# Altium integrated library ADLib_GoodToUse.IntLib: 276 symbols (part 1 of 2)
Pins are listed as number, name and electrical type; pins without a type are passive.

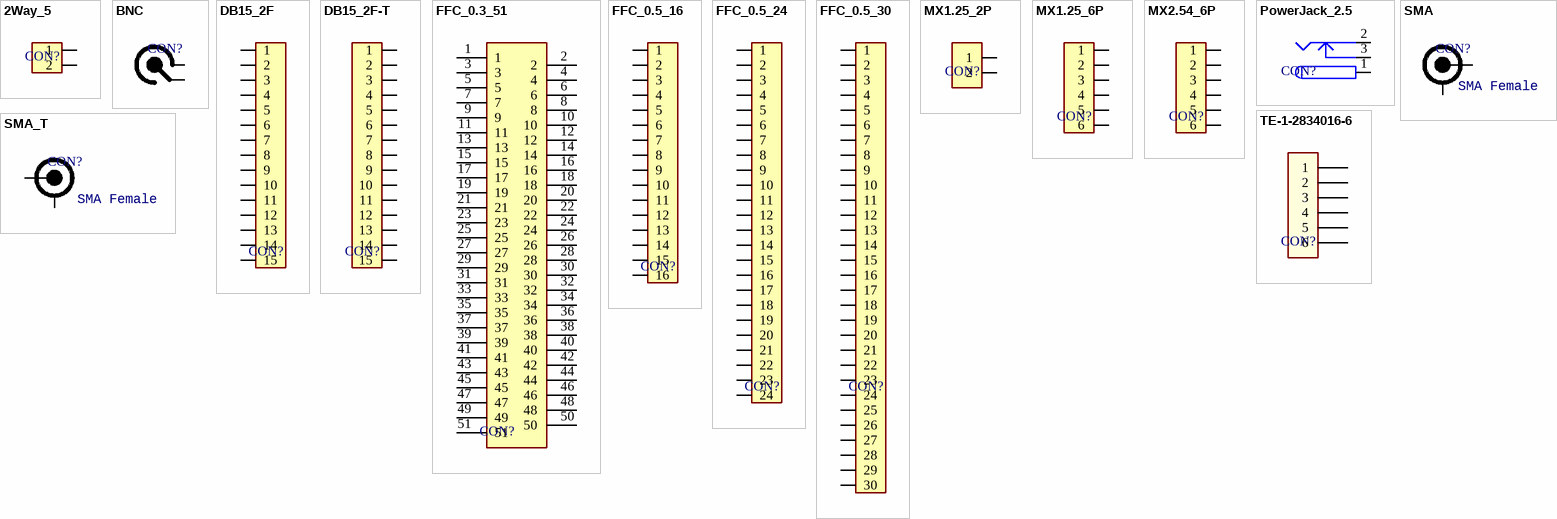
[diagram p0: symbols 2Way_5 to TE-1-2834016-6]

## 2Way_5
designator CON?  (value not drawn)
DB
footprint 2Way_5
pins: 1, 2

## BNC
designator CON?  (value not drawn)
footprint BNC_4P
pins: 1, 2

## DB15_2F
designator CON?  (value not drawn)
DB
footprint DB15_2F
pins: 1, 2, 3, 4, 5, 6, 7, 8, 9, 10, 11, 12, 13, 14, 15

## DB15_2F-T
designator CON?  (value not drawn)
DB
footprint DB15_2F
pins: 1, 2, 3, 4, 5, 6, 7, 8, 9, 10, 11, 12, 13, 14, 15

## FFC_0.3_51
designator CON?  (value not drawn)
FFC
footprint FFC_0.3_51
pins: 1, 2, 3, 4, 5, 6, 7, 8, 9, 10, 11, 12, 13, 14, 15, 16, 17, 18, 19, 20, 21, 22, 23, 24, 25, 26, 27, 28, 29, 30, 31, 32, 33, 34, 35, 36, 37, 38, 39, 40, 41, 42, 43, 44, 45, 46, 47, 48, 49, 50, 51

## FFC_0.5_16
designator CON?  (value not drawn)
FFC
footprint FFC_0.5_16
pins: 1, 2, 3, 4, 5, 6, 7, 8, 9, 10, 11, 12, 13, 14, 15, 16

## FFC_0.5_24
designator CON?  (value not drawn)
FFC
footprint FFC_0.5_24 (Connector; FH12 Series; 24 Position; 0.5mm Spaced Bottom Contact)
pins: 1, 2, 3, 4, 5, 6, 7, 8, 9, 10, 11, 12, 13, 14, 15, 16, 17, 18, 19, 20, 21, 22, 23, 24

## FFC_0.5_30
designator CON?  (value not drawn)
FFC
footprint FFC_0.5_30
pins: 1, 2, 3, 4, 5, 6, 7, 8, 9, 10, 11, 12, 13, 14, 15, 16, 17, 18, 19, 20, 21, 22, 23, 24, 25, 26, 27, 28, 29, 30

## MX1.25_2P
designator CON?  (value not drawn)
MX
footprint MX1.25_S90_2P
pins: 1, 2

## MX1.25_6P
designator CON?  (value not drawn)
MX
footprint MX1.25_S90_6P
footprint MX1.25s_S90_6P
pins: 0, 1, 2, 3, 4, 5, 6

## MX2.54_6P
designator CON?  (value not drawn)
MX
footprint MX2.54_S90_6P
pins: 1, 2, 3, 4, 5, 6

## PowerJack_2.5
designator CON?  (value not drawn)
DC Power Jack
footprint KLD_0202
pins: 1 (power), 2 (power), 3 (power)

## SMA
designator CON?  type: SMA Female  (hidden comment: SMA)
footprint SMA_KE_90
pins: 1, 2

## SMA_T
designator CON?  type: SMA Female  (hidden comment: SMA_T)
SMA
footprint SMA_KE_90
pins: 1, 2

## TE-1-2834016-6
designator CON?  (value not drawn)
MX; MFR: TE; Package: DIP; PartNumber: TE-1-2834016-6
footprint TE-1-2834016-6
pins: 1, 2, 3, 4, 5, 6


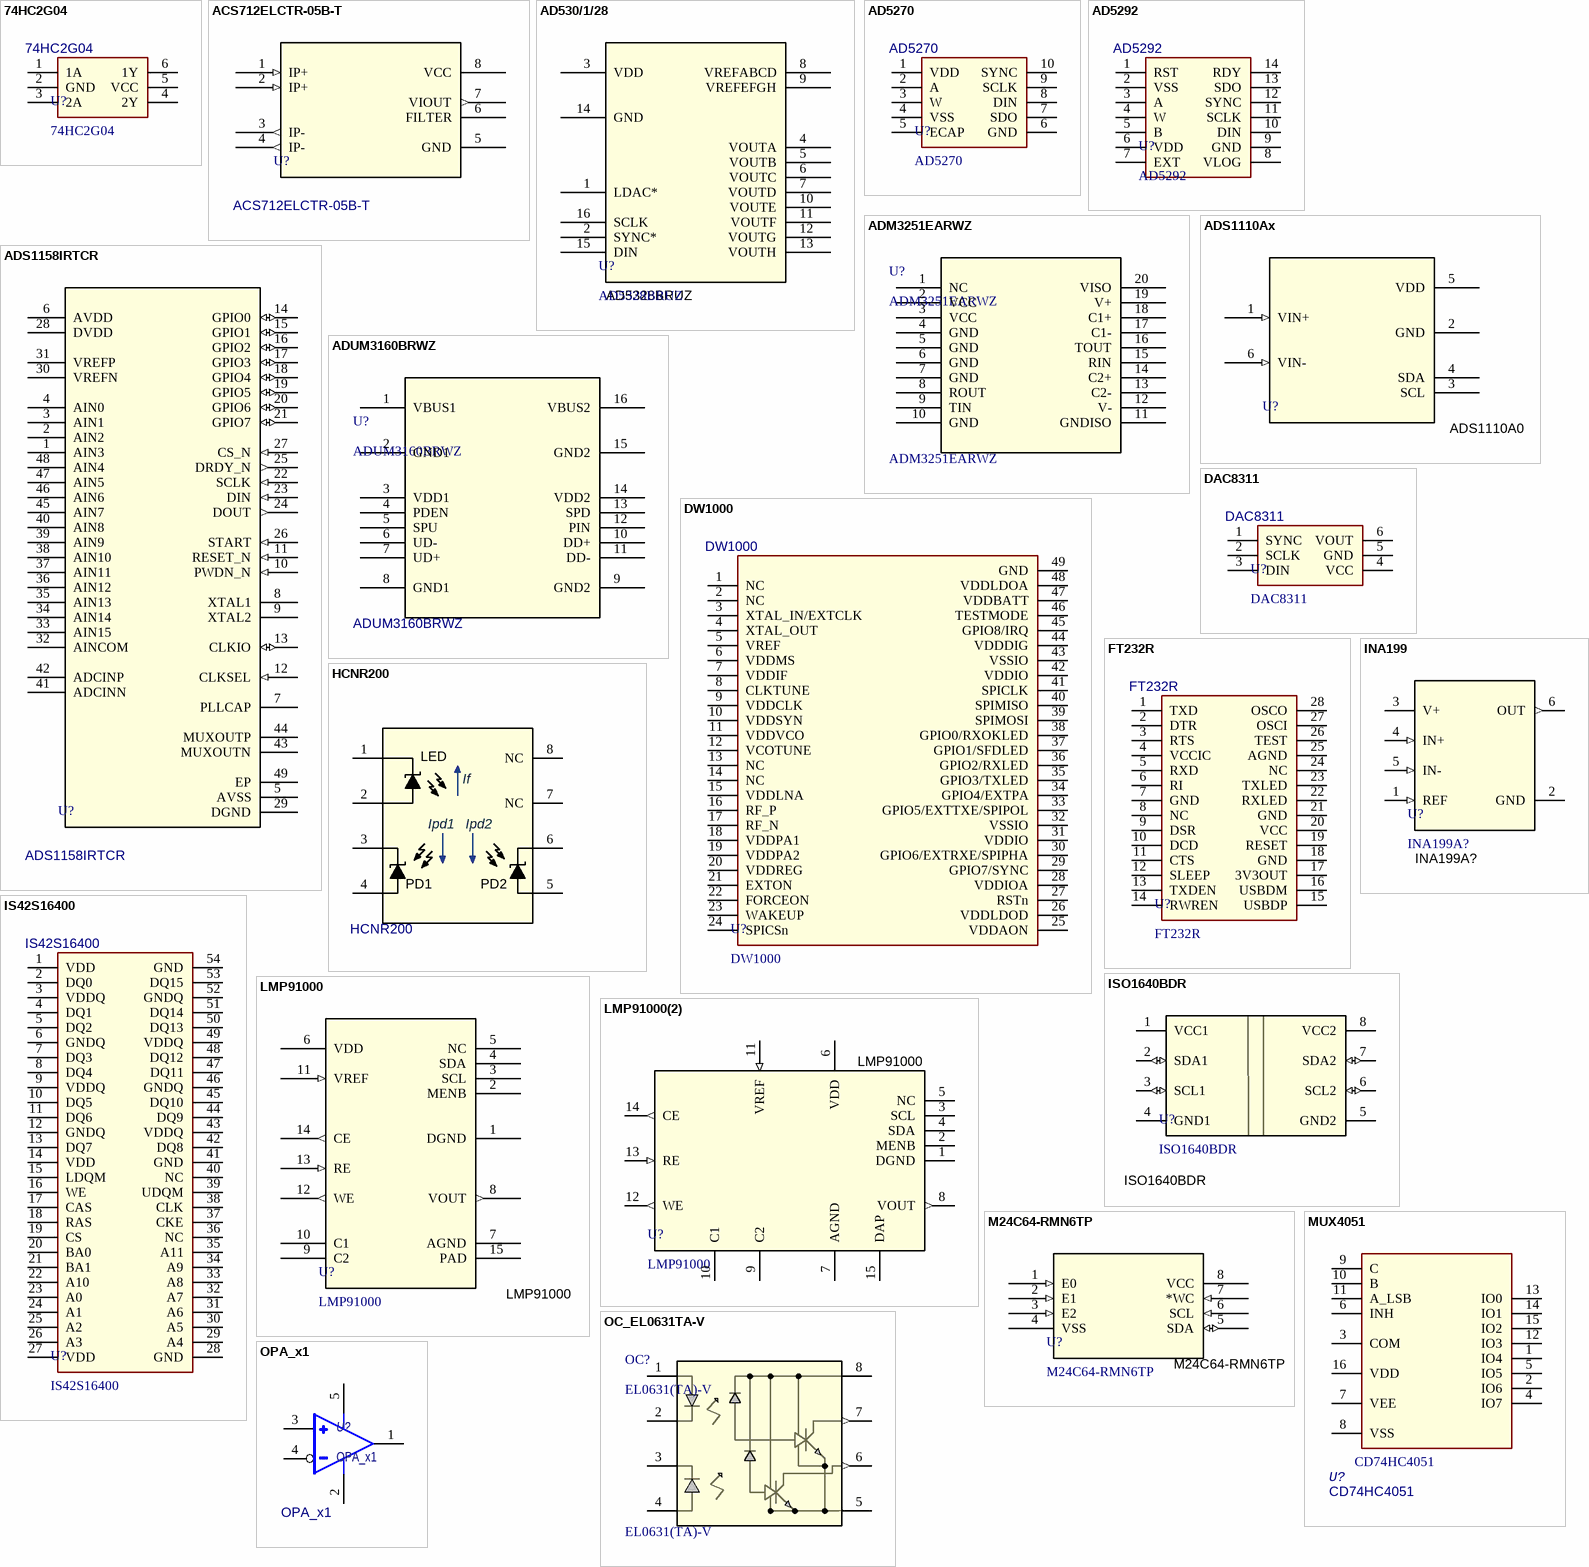
[diagram p1: symbols 74HC2G04 to OPA_x1]

## 74HC2G04
designator U?
74 Series; Package: SOT363-6; PartNumber: 74HC2G04
footprint SOT363-6_L2.0-W1.3-P0.65
pins: 1 1A, 2 GND, 3 2A, 4 2Y, 5 VCC, 6 1Y

## ACS712ELCTR-05B-T
designator U?
current sensor; Mfr_Name: Allegro Microsystems Inc.; Package: SOIC8; PartNumber: ACS712ELCTR-05B-T
footprint SOP-8_L5.0-W3.8-P1.27
pins: 1 IP+ (in), 2 IP+ (in), 3 IP- (out), 4 IP- (out), 5 GND (power), 6 FILTER, 7 VIOUT (out), 8 VCC (power)

## AD530/1/28
designator U?, comment AD5328BRUZ
ADI DAC; Mfr_Name: Analog Devices Inc; Package: TSSOP-16; PartNumber: AD5328BRUZ
footprint TSSOP-16_L5.0-W4.4-P0.65
pins: 1 LDAC*, 2 SYNC*, 3 VDD (power), 4 VOUTA, 5 VOUTB, 6 VOUTC, 7 VOUTD, 8 VREFABCD, 9 VREFEFGH, 10 VOUTE, 11 VOUTF, 12 VOUTG, 13 VOUTH, 14 GND, 15 DIN, 16 SCLK

## AD5270
designator U?
Digital Pot; PartNumber: AD5270
footprint TSSOP-10_L3.0-W3.0-P0.50 (TSSOP, 10PIN)
pins: 1 VDD, 2 A, 3 W, 4 VSS, 5 ECAP, 6 GND, 7 SDO, 8 DIN, 9 SCLK, 10 SYNC

## AD5292
designator U?
Digital Pot; PartNumber: AD5292
footprint TSSOP-14_L5.0-W4.4-P0.65
pins: 1 RST, 2 VSS, 3 A, 4 W, 5 B, 6 VDD, 7 EXT, 8 VLOG, 9 GND, 10 DIN, 11 SCLK, 12 SYNC, 13 SDO, 14 RDY

## ADM3251EARWZ
designator U?
RS232 Isolator; Mfr_Name: Analog Devices Inc; Package: RW-20-ADI; PartNumber: ADM3251EARWZ
footprint SOP-20_L12.8-W7.5-P1.27 (13*10.6*2.6（长宽高）)
pins: 1 NC, 2 VCC, 3 VCC, 4 GND, 5 GND, 6 GND, 7 GND, 8 ROUT, 9 TIN, 10 GND, 11 GNDISO, 12 V-, 13 C2-, 14 C2+, 15 RIN, 16 TOUT, 17 C1-, 18 C1+, 19 V+, 20 VISO

## ADS1110Ax
designator U?, comment ADS1110A0
ADC; Mfr_Name: Texas Instruments; Package: SOT-23-6; PartNumber: ADS1110A0
footprint SOT23-6_L2.9-W1.6-P0.95
pins: 1 VIN+ (in), 2 GND (power), 3 SCL, 4 SDA, 5 VDD (power), 6 VIN- (in)

## ADS1158IRTCR
designator U?
ADC; Mfr_Name: Texas Instruments; Package: RTC (S-PVQFN-N48); PartNumber: ADS1158IRTCR
footprint QFN-48_L7.0-W7.0-P0.5-EP
pins: 1 AIN3, 2 AIN2, 3 AIN1, 4 AIN0, 5 AVSS (power), 6 AVDD (power), 7 PLLCAP, 8 XTAL1, 9 XTAL2, 10 PWDN_N (in), 11 RESET_N (in), 12 CLKSEL (in), 13 CLKIO (io), 14 GPIO0 (io), 15 GPIO1 (io), 16 GPIO2 (io), 17 GPIO3 (io), 18 GPIO4 (io), 19 GPIO5 (io), 20 GPIO6 (io), 21 GPIO7 (io), 22 SCLK (in), 23 DIN (in), 24 DOUT (out), 25 DRDY_N (out), 26 START (in), 27 CS_N (in), 28 DVDD (power), 29 DGND (power), 30 VREFN, 31 VREFP, 32 AINCOM, 33 AIN15, 34 AIN14, 35 AIN13, 36 AIN12, 37 AIN11, 38 AIN10, 39 AIN9, 40 AIN8, 41 ADCINN, 42 ADCINP, 43 MUXOUTN, 44 MUXOUTP, 45 AIN7, 46 AIN6, 47 AIN5, 48 AIN4, 49 EP

## ADUM3160BRWZ
designator U?
USB隔离器; Mfr_Name: Analog Devices Inc; Package: RW_16_ADI; PartNumber: ADUM3160BRWZ
footprint SOP-16_L10.3-W7.5-P1.27 (10.3*10.3*2.6mm（长宽高）)
pins: 1 VBUS1, 2 GND1, 3 VDD1, 4 PDEN, 5 SPU, 6 UD-, 7 UD+, 8 GND1, 9 GND2, 10 DD+, 11 DD-, 12 PIN, 13 SPD, 14 VDD2, 15 GND2, 16 VBUS2

## DAC8311
designator U?
DAC; PartNumber: DAC8311
footprint SOT363-6_L2.0-W1.3-P0.65
pins: 1 SYNC, 2 SCLK, 3 DIN, 4 VCC, 5 GND, 6 VOUT

## DW1000
designator U?
UWB; Package: QFN48 P0.4; PartNumber: DW1000
footprint QFN-48_L6.0-W6.0-P0.4-EP
pins: 1 NC, 2 NC, 3 XTAL_IN/EXTCLK, 4 XTAL_OUT, 5 VREF, 6 VDDMS, 7 VDDIF, 8 CLKTUNE, 9 VDDCLK, 10 VDDSYN, 11 VDDVCO, 12 VCOTUNE, 13 NC, 14 NC, 15 VDDLNA, 16 RF_P, 17 RF_N, 18 VDDPA1, 19 VDDPA2, 20 VDDREG, 21 EXTON, 22 FORCEON, 23 WAKEUP, 24 SPICSn, 25 VDDAON, 26 VDDLDOD, 27 RSTn, 28 VDDIOA, 29 GPIO7/SYNC, 30 GPIO6/EXTRXE/SPIPHA, 31 VDDIO, 32 VSSIO, 33 GPIO5/EXTTXE/SPIPOL, 34 GPIO4/EXTPA, 35 GPIO3/TXLED, 36 GPIO2/RXLED, 37 GPIO1/SFDLED, 38 GPIO0/RXOKLED, 39 SPIMOSI, 40 SPIMISO, 41 SPICLK, 42 VDDIO, 43 VSSIO, 44 VDDDIG, 45 GPIO8/IRQ, 46 TESTMODE, 47 VDDBATT, 48 VDDLDOA, 49 GND

## FT232R
designator U?
USB2UART; PartNumber: FT232R
footprint SSOP_E210_P0.65_28
pins: 1 TXD, 2 DTR, 3 RTS, 4 VCCIC, 5 RXD, 6 RI, 7 GND, 8 NC, 9 DSR, 10 DCD, 11 CTS, 12 SLEEP, 13 TXDEN, 14 RWREN, 15 USBDP, 16 USBDM, 17 3V3OUT, 18 GND, 19 RESET, 20 VCC, 21 GND, 22 RXLED, 23 TXLED, 24 NC, 25 AGND, 26 TEST, 27 OSCI, 28 OSCO

## HCNR200
designator U?
高线性光耦; Mfr_Name: Mfr; Package: SOP-8-2.54mm; PartNumber: HCNR200
footprint SOP_P2.54mm_8
pins: 1, 2, 3, 4, 5, 6, 7 NC, 8 NC
text: LED; If; Ipd1; Ipd2; PD1; PD2

## INA199
designator U?, comment INA199A?
current-sense amplifier; Mfr_Name: Texas Instruments; Package: SOT-363(SC-70-6); PartNumber: INA199A?
footprint SOT363-6
pins: 1 REF (in), 2 GND (power), 3 V+ (power), 4 IN+ (in), 5 IN- (in), 6 OUT (out)

## IS42S16400
designator U?
SDRAM; PartNumber: IS42S16400
footprint TSOP_E400_P0.8_54
pins: 1 VDD, 2 DQ0, 3 VDDQ, 4 DQ1, 5 DQ2, 6 GNDQ, 7 DQ3, 8 DQ4, 9 VDDQ, 10 DQ5, 11 DQ6, 12 GNDQ, 13 DQ7, 14 VDD, 15 LDQM, 16 WE, 17 CAS, 18 RAS, 19 CS, 20 BA0, 21 BA1, 22 A10, 23 A0, 24 A1, 25 A2, 26 A3, 27 VDD, 28 GND, 29 A4, 30 A5, 31 A6, 32 A7, 33 A8, 34 A9, 35 A11, 36 NC, 37 CKE, 38 CLK, 39 UDQM, 40 NC, 41 GND, 42 DQ8, 43 VDDQ, 44 DQ9, 45 DQ10, 46 GNDQ, 47 DQ11, 48 DQ12, 49 VDDQ, 50 DQ13, 51 DQ14, 52 GNDQ, 53 DQ15, 54 GND

## ISO1640BDR
designator U?
I2C Isolator; Mfr_Name: Texas Instruments; Package: SOIC-8; PartNumber: ISO1640BDR
footprint SOIC-8_150mil
pins: 1 VCC1 (power), 2 SDA1 (io), 3 SCL1 (io), 4 GND1 (power), 5 GND2 (power), 6 SCL2 (io), 7 SDA2 (io), 8 VCC2 (power)

## LMP91000
designator U?
EC Sensor AFE; Mfr_Name: Texas Instruments; Package: WSON-14; PartNumber: LMP91000
footprint WSON-14-EP(4x4)
pins: 1 DGND (power), 2 MENB, 3 SCL, 4 SDA, 5 NC, 6 VDD (power), 7 AGND (power), 8 VOUT (out), 9 C2, 10 C1, 11 VREF (in), 12 WE (out), 13 RE (in), 14 CE (out), 15 PAD

## LMP91000(2)
designator U?, comment LMP91000
AFE; Mfr_Name: Texas Instruments; Package: WSON-14-EP(4x4); PartNumber: LMP91000
footprint WSON-14-EP(4x4)
pins: 1 DGND (power), 2 MENB, 3 SCL, 4 SDA, 5 NC, 6 VDD (power), 7 AGND (power), 8 VOUT (out), 9 C2, 10 C1, 11 VREF (in), 12 WE (out), 13 RE (in), 14 CE (out), 15 DAP

## M24C64-RMN6TP
designator U?
EEPROM; Mfr_Name: STMicroelectronics; Package: SOIC8; PartNumber: M24C64-RMN6TP
footprint SOP_E150_8
pins: 1 E0 (in), 2 E1 (in), 3 E2 (in), 4 VSS (power), 5 SDA (io), 6 SCL (in), 7 *WC (in), 8 VCC (power)

## MUX4051
designator U?, comment CD74HC4051
模拟开关; Package: TSSOP-16; PartNumber: CD74HC4051
footprint TSSOP_E170_P0.65_16
pins: 1 IO4, 2 IO6, 3 COM, 4 IO7, 5 IO5, 6 INH, 7 VEE, 8 VSS, 9 C, 10 B, 11 A_LSB, 12 IO3, 13 IO0, 14 IO1, 15 IO2, 16 VDD

## OC_EL0631TA-V
designator OC?, comment EL0631(TA)-V
Optical Coupler Logic Output x2; Mfr_Name: Everlight; Package: SOIC-8; PartNumber: EL0631(TA)-V
footprint SOP-8_L5.0-W3.8-P1.27-OPTO
pins: 1, 2, 3, 4, 5 (power), 6 (out), 7 (out), 8 (power)

## OPA_x1
designator U?
operational amplifier; Mfr_Name: Mfr?; Package: SOT23-5; PartNumber: OPA_x1
footprint SOT23-5_L2.9-W1.6-P0.95
pins: 1 OUT, 2 VS- (power), 3 IN+, 4 IN-, 5 VS+ (power)

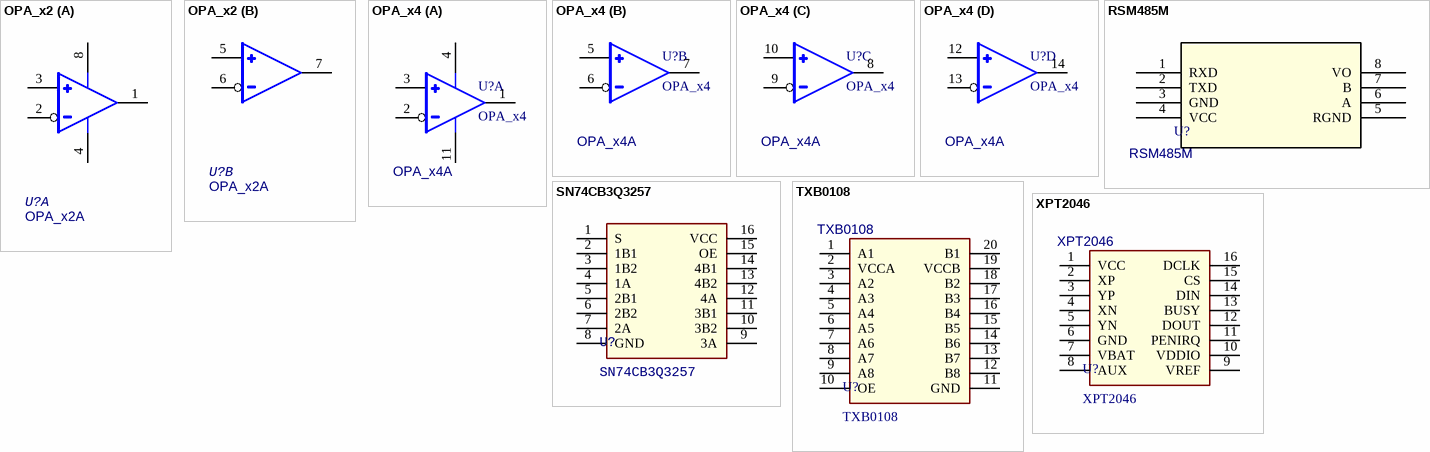
[diagram p2: symbols OPA_x2 to XPT2046]

## OPA_x2
designator U?  PartNumber: OPA_x2A  (hidden comment: OPA_x2)
operational amplifier; Mfr_Name: Mfr?; Package: SOIC8
footprint TSSOP-8_L3.0-W3.0-P0.65 (3.00×4.00×1.00 e=0.65mm)
footprint SOP-8_L5.0-W3.8-P1.27
part A pins: 1 OUT_A, 2 IN-_A, 3 IN+_A, 4 VS- (power), 8 VS+ (power)
part B pins: 5 IN+_B, 6 IN-_B, 7 OUT_B

## OPA_x4
designator U?  PartNumber: OPA_x4A
operational amplifier; Mfr_Name: Mfr?; Package: PkgRef?
footprint TSSOP-14_L5.0-W4.4-P0.65
part A pins: 1 OUT_A, 2 IN-_A, 3 IN+_A, 4 VS+ (power), 11 VS- (power)
part B pins: 5 IN+_B, 6 IN-_B, 7 OUT_B
part C pins: 8 OUT_C, 9 IN-_C, 10 IN+_C
part D pins: 12 IN+_D, 13 IN-_D, 14 OUT_D

## RSM485M
designator U?
RS485 Isolator; Mfr_Name: ZGL; Package: DIP-8; PartNumber: RSM485M
footprint COMM-TH_RSM485M
pins: 1 RXD, 2 TXD, 3 GND, 4 VCC, 5 RGND, 6 A, 7 B, 8 VO

## SN74CB3Q3257
designator U?
Bus Switch; Package: TSSOP16 P0.65; PartNumber: SN74CB3Q3257
footprint TSSOP-16_L5.0-W4.4-P0.65
pins: 1 S, 2 1B1, 3 1B2, 4 1A, 5 2B1, 6 2B2, 7 2A, 8 GND, 9 3A, 10 3B2, 11 3B1, 12 4A, 13 4B2, 14 4B1, 15 OE, 16 VCC

## TXB0108
designator U?
Voltage Level Translator; PartNumber: TXB0108
footprint TSSOP-20_L6.5-W4.4-P0.65
pins: 1 A1, 2 VCCA, 3 A2, 4 A3, 5 A4, 6 A5, 7 A6, 8 A7, 9 A8, 10 OE, 11 GND, 12 B8, 13 B7, 14 B6, 15 B5, 16 B4, 17 B3, 18 B2, 19 VCCB, 20 B1

## XPT2046
designator U?
Touch; PartNumber: XPT2046
footprint TSSOP-16_L5.0-W4.4-P0.65
pins: 1 VCC, 2 XP, 3 YP, 4 XN, 5 YN, 6 GND, 7 VBAT, 8 AUX, 9 VREF, 10 VDDIO, 11 PENIRQ, 12 DOUT, 13 BUSY, 14 DIN, 15 CS, 16 DCLK


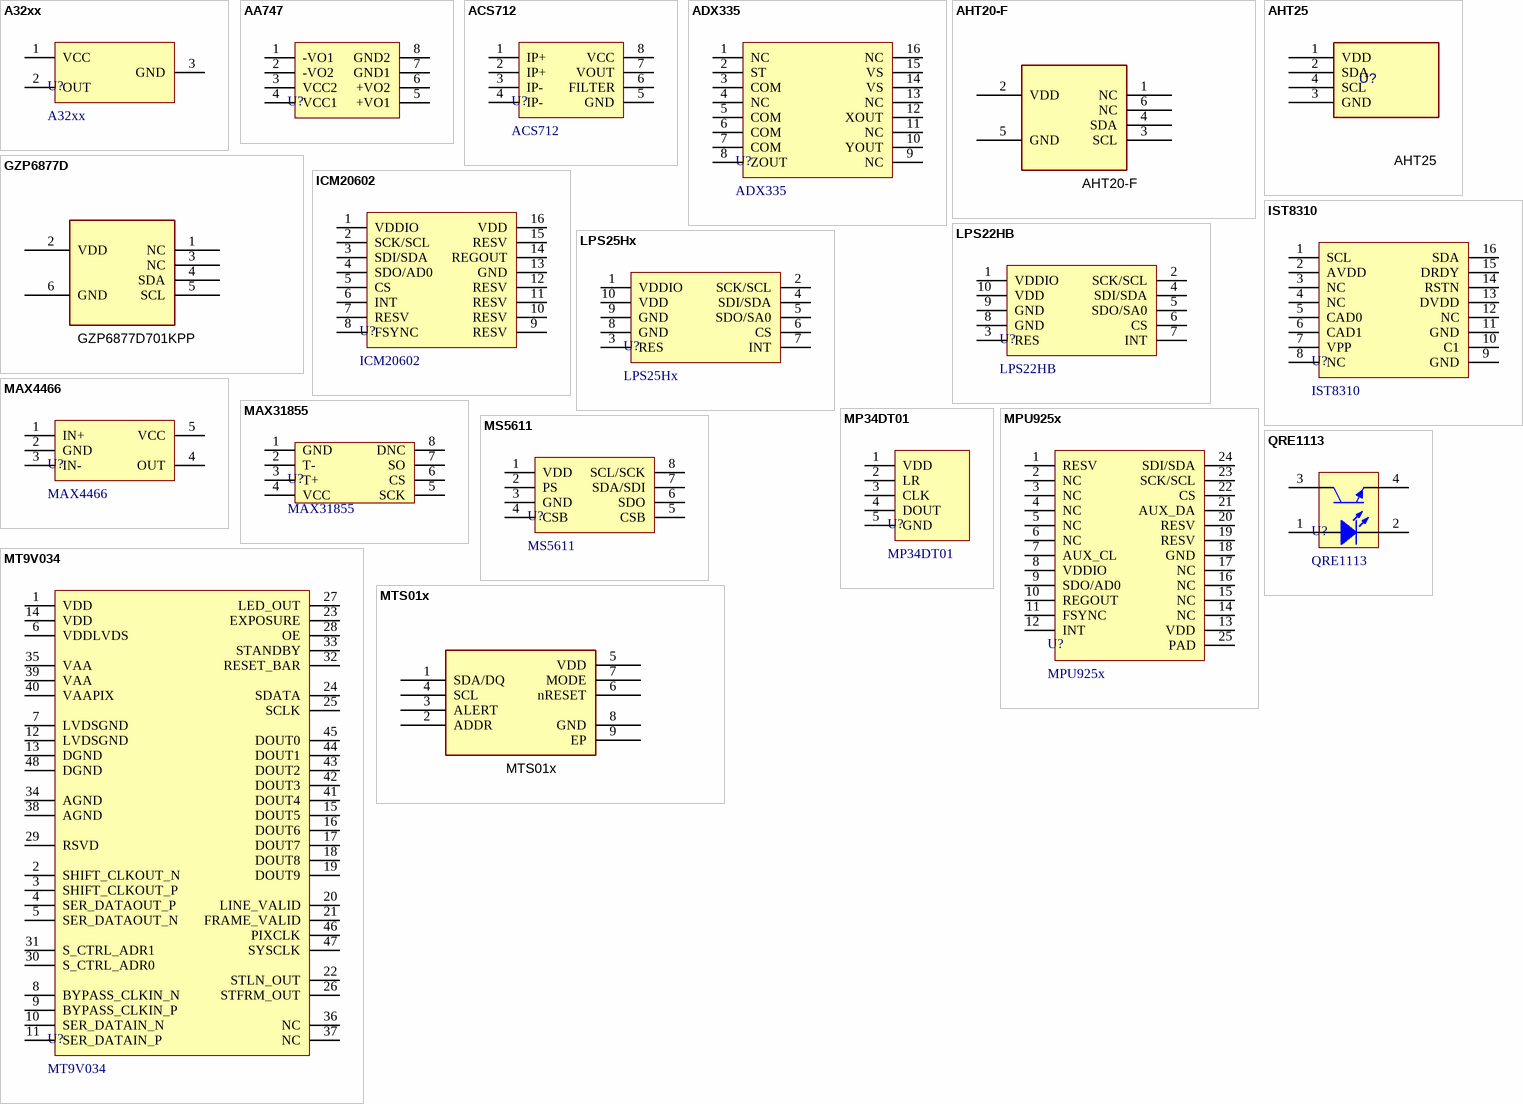
[diagram p3: symbols A32xx to QRE1113]

## A32xx
designator U?
Sensor Hall; Type: *
footprint SOT23-3
pins: 1 VCC, 2 OUT, 3 GND

## AA747
designator U?  (value not drawn)
Sensor Angular; Manufacturer: Sensitec GmbH; Value: E150 P1.27; Specification: -40 °C to +150 °C; Type: SOP8; Parameter 1: *
footprint SOP_E150_8
pins: 1 -VO1, 2 -VO2, 3 VCC2, 4 VCC1, 5 +VO1, 6 +VO2, 7 GND1, 8 GND2

## ACS712
designator U?
Sensor Current; Type: *
footprint SOP_E150_8
pins: 1 IP+, 2 IP+, 3 IP-, 4 IP-, 5 GND, 6 FILTER, 7 VOUT, 8 VCC

## ADX335
designator U?
Sensor Motion; Type: *
footprint QFN_P0.65_16
pins: 1 NC, 2 ST, 3 COM, 4 NC, 5 COM, 6 COM, 7 COM, 8 ZOUT, 9 NC, 10 YOUT, 11 NC, 12 XOUT, 13 NC, 14 VS, 15 VS, 16 NC

## AHT20-F
designator U?
温湿度传感器; Mfr_Name: 广州奥松; PackageReference: SMD-6P; PartNumber: AHT20-F
footprint SMD_6P_3x3
pins: 1 NC, 2 VDD, 3 SCL, 4 SDA, 5 GND, 6 NC

## AHT25
designator U?
温湿度传感器; Mfr_Name: 广州奥松; PackageReference: SMD-6P; PartNumber: AHT25
footprint DIP_2.54_4_DHTSENSOR
pins: 1 VDD, 2 SDA, 3 GND, 4 SCL

## GZP6877D
designator U?, comment GZP6877D701KPP
Gas Pressure Sensor; Mfr_Name: Sencoch; PackageReference: SMD6; PartNumber: GZP6877D701KPP
footprint SMD_6P_8.4X8.4
pins: 1 NC, 2 VDD, 3 NC, 4 SDA, 5 SCL, 6 GND

## ICM20602
designator U?
Sensor Motion; Type: LGA16 P0.5
footprint LGA_P0.5_16
pins: 1 VDDIO, 2 SCK/SCL, 3 SDI/SDA, 4 SDO/AD0, 5 CS, 6 INT, 7 RESV, 8 FSYNC, 9 RESV, 10 RESV, 11 RESV, 12 RESV, 13 GND, 14 REGOUT, 15 RESV, 16 VDD

## IST8310
designator U?
Sensor Magnetometer; Type: QFN16 P0.5
footprint QFN_P0.5_16
pins: 1 SCL, 2 AVDD, 3 NC, 4 NC, 5 CAD0, 6 CAD1, 7 VPP, 8 NC, 9 GND, 10 C1, 11 GND, 12 NC, 13 DVDD, 14 RSTN, 15 DRDY, 16 SDA

## LPS22HB
designator U?
Sensor Pressure; Type: LGA10 P0.5
footprint HCLGA-2x2_10
pins: 1 VDDIO, 2 SCK/SCL, 3 RES, 4 SDI/SDA, 5 SDO/SA0, 6 CS, 7 INT, 8 GND, 9 GND, 10 VDD

## LPS25Hx
designator U?
Sensor Pressure
footprint HCLGA-2.5x2.5_10
pins: 1 VDDIO, 2 SCK/SCL, 3 RES, 4 SDI/SDA, 5 SDO/SA0, 6 CS, 7 INT, 8 GND, 9 GND, 10 VDD

## MAX4466
designator U?
Sensor Microphone
footprint SOT23-5
pins: 1 IN+, 2 GND, 3 IN-, 4 OUT, 5 VCC

## MAX31855
designator U?
Sensor Thermocouple
footprint SOIC_E200_8
pins: 1 GND, 2 T-, 3 T+, 4 VCC, 5 SCK, 6 CS, 7 SO, 8 DNC

## MP34DT01
designator U?
Sensor Microphone
footprint HCLGA_3x4_4
pins: 1 VDD, 2 LR, 3 CLK, 4 DOUT, 5 GND

## MPU925x
designator U?
Sensor Motion; Type: QFN24 P0.4
footprint QFN_P0.4_24
pins: 1 RESV, 2 NC, 3 NC, 4 NC, 5 NC, 6 NC, 7 AUX_CL, 8 VDDIO, 9 SDO/AD0, 10 REGOUT, 11 FSYNC, 12 INT, 13 VDD, 14 NC, 15 NC, 16 NC, 17 NC, 18 GND, 19 RESV, 20 RESV, 21 AUX_DA, 22 CS, 23 SCK/SCL, 24 SDI/SDA, 25 PAD

## MS5611
designator U?
Sensor Barometer
footprint OTHER_MS5611_8
pins: 1 VDD, 2 PS, 3 GND, 4 CSB, 5 CSB, 6 SDO, 7 SDA/SDI, 8 SCL/SCK

## MT9V034
designator U?
Sensor Camera
footprint CLCC_48 (LCC, 48-Pins, Body 11.43x11.43mmx2.30mm, Pitch 0.80mm, IPC Medium Density)
pins: 1 VDD, 2 SHIFT_CLKOUT_N, 3 SHIFT_CLKOUT_P, 4 SER_DATAOUT_P, 5 SER_DATAOUT_N, 6 VDDLVDS, 7 LVDSGND, 8 BYPASS_CLKIN_N, 9 BYPASS_CLKIN_P, 10 SER_DATAIN_N, 11 SER_DATAIN_P, 12 LVDSGND, 13 DGND, 14 VDD, 15 DOUT5, 16 DOUT6, 17 DOUT7, 18 DOUT8, 19 DOUT9, 20 LINE_VALID, 21 FRAME_VALID, 22 STLN_OUT, 23 EXPOSURE, 24 SDATA, 25 SCLK, 26 STFRM_OUT, 27 LED_OUT, 28 OE, 29 RSVD, 30 S_CTRL_ADR0, 31 S_CTRL_ADR1, 32 RESET_BAR, 33 STANDBY, 34 AGND, 35 VAA, 36 NC, 37 NC, 38 AGND, 39 VAA, 40 VAAPIX, 41 DOUT4, 42 DOUT3, 43 DOUT2, 44 DOUT1, 45 DOUT0, 46 PIXCLK, 47 SYSCLK, 48 DGND

## MTS01x
designator U?
温度传感器; MFR: Mysentech(敏源传感); Package: TDFN-8-EP(2.5x2.5); PartNumber: MTS01x
footprint DFN_P0.5_8_2.5x2.5_EP
pins: 1 SDA/DQ, 2 ADDR, 3 ALERT, 4 SCL, 5 VDD, 6 nRESET, 7 MODE, 8 GND, 9 EP

## QRE1113
designator U?
Sensor IR
footprint QRE1113GR
pins: 1 A, 2 C, 3 C, 4 E


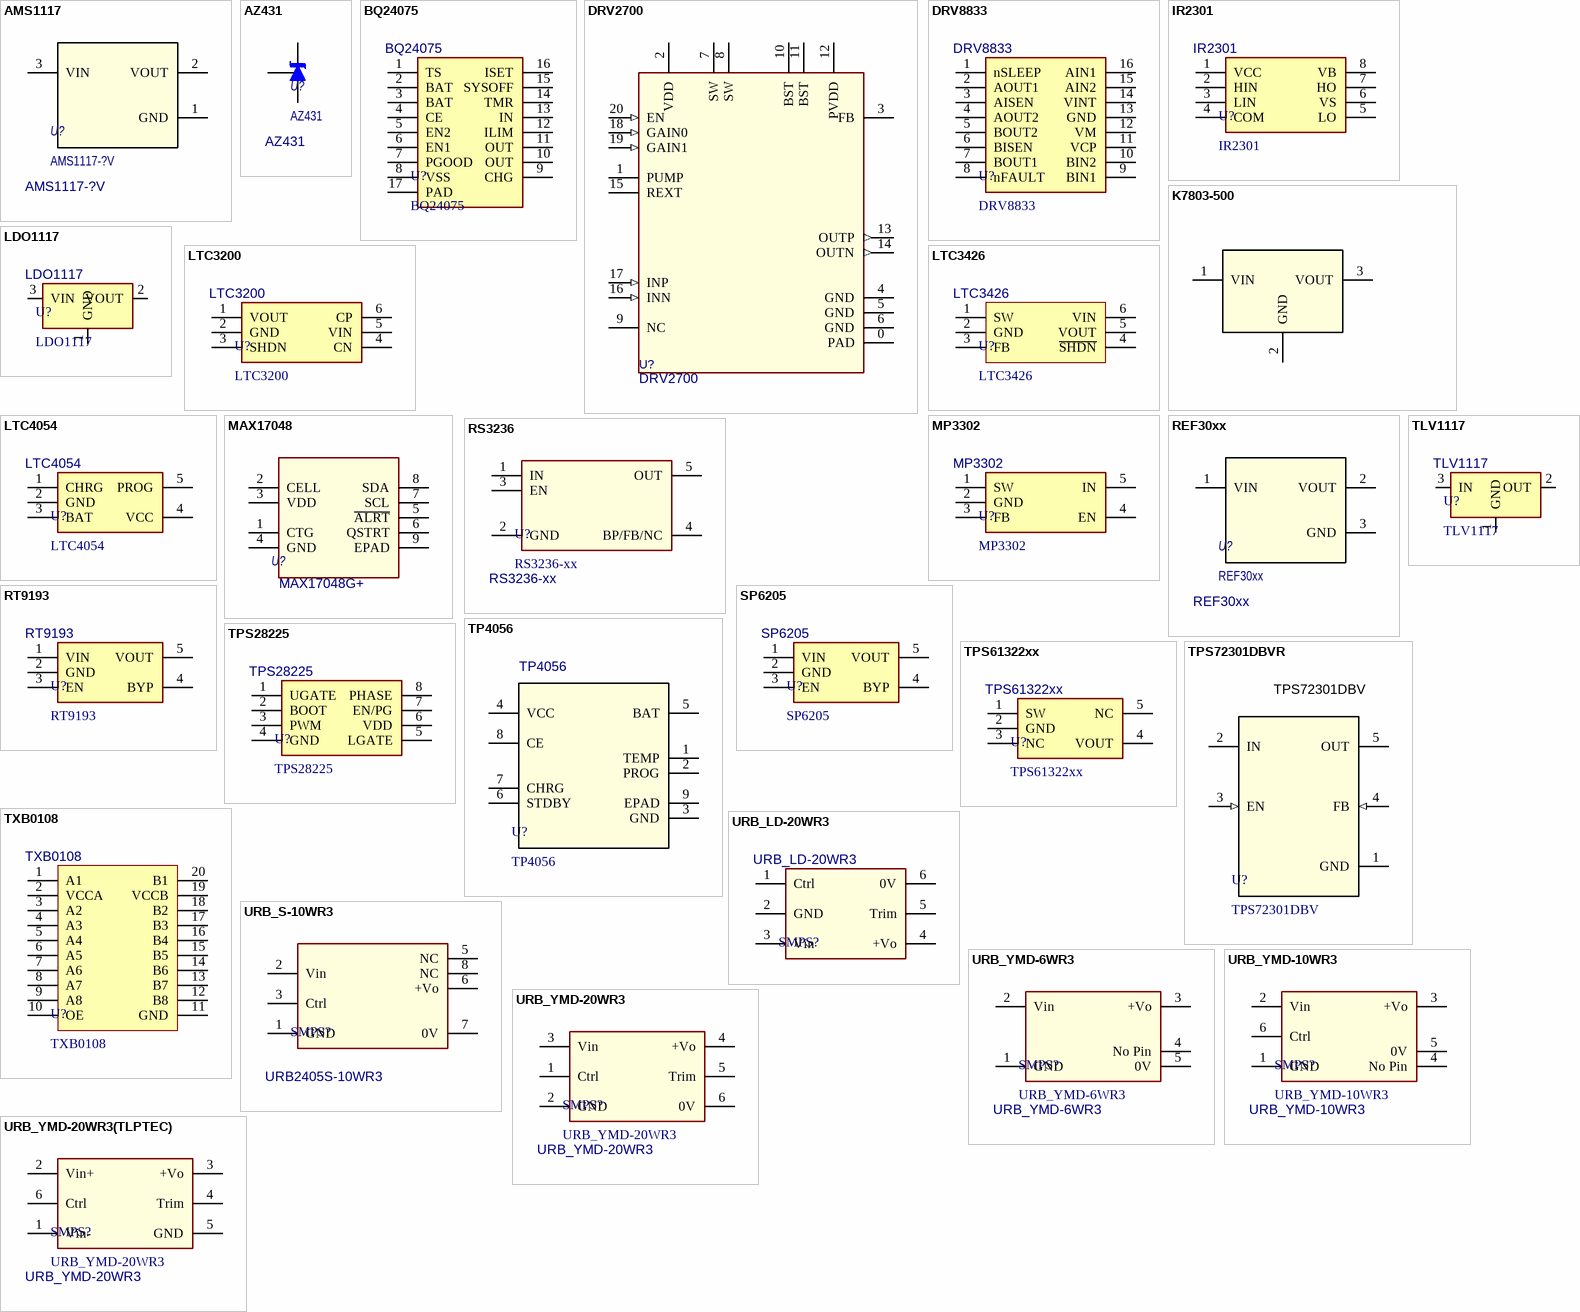
[diagram p4: symbols AMS1117 to URB_YMD-20WR3(TLPTEC)]

## AMS1117
designator U?, comment AMS1117-?V
LDO; MFR: Mfr?; Package: SOT-223-3; PartNumber: AMS1117-?V
footprint SOT223-3_L6.5-W3.5-P2.3
pins: 1 GND, 2 VOUT, 3 VIN

## AZ431
designator U?
Voltage reference source; MFR: TI; Package: SOT-23; PartNumber: AZ431
footprint SOT23-3_L2.9-W1.3-P1.9
pins: 1 REF, 2 CATHODE, 3 ANODE

## BQ24075
designator U?
Power; Type: QFN16 P0.5; PartNumber: BQ24075
footprint QFN-16_L4.0-W4.0-P0.65-EP
pins: 1 TS, 2 BAT, 3 BAT, 4 CE, 5 EN2, 6 EN1, 7 PGOOD, 8 VSS, 9 CHG, 10 OUT, 11 OUT, 12 ILIM, 13 IN, 14 TMR, 15 SYSOFF, 16 ISET, 17 PAD

## DRV2700
designator U?
MFR: TI; Package: QFN20-EP(4x4); PartNumber: DRV2700
footprint QFN-20_L4.0-W4.0-P0.5-EP
pins: 0 PAD, 1 PUMP, 2 VDD, 3 FB, 4 GND (power), 5 GND (power), 6 GND (power), 7 SW (oc), 8 SW (oc), 9 NC, 10 BST (power), 11 BST (power), 12 PVDD (power), 13 OUTP (out), 14 OUTN (out), 15 REXT, 16 INN (in), 17 INP (in), 18 GAIN0 (in), 19 GAIN1 (in), 20 EN (in)

## DRV8833
designator U?
H-Bridge; Package: *; PartNumber: DRV8833
footprint TSSOP-16_L5.0-W4.4-P0.65
pins: 1 nSLEEP, 2 AOUT1, 3 AISEN, 4 AOUT2, 5 BOUT2, 6 BISEN, 7 BOUT1, 8 nFAULT, 9 BIN1, 10 BIN2, 11 VCP, 12 VM, 13 GND, 14 VINT, 15 AIN2, 16 AIN1

## IR2301
designator U?
MOSFET Driver; Package: *; PartNumber: IR2301
footprint SOP-8_L5.0-W3.8-P1.27
pins: 1 VCC, 2 HIN, 3 LIN, 4 COM, 5 LO, 6 VS, 7 HO, 8 VB

## K7803-500
designator U?, comment K7803-500R3
3.3V DCDC Module; MFR: MORNSUN; Package: SIP3; PartNumber: K7803-500R3
pins: 1 VIN, 2 GND, 3 VOUT

## LDO1117
designator U?
Power; Package: SOT223-3; PartNumber: LDO1117
footprint SOT223-3_L6.5-W3.5-P2.3
pins: 1 GND, 2 VOUT, 3 VIN

## LTC3200
designator U?
Power; Package: SOT23-6; PartNumber: LTC3200
footprint SOT23-6_L2.9-W1.6-P0.95
pins: 1 VOUT, 2 GND, 3 SHDN, 4 CN, 5 VIN, 6 CP

## LTC3426
designator U?
Power; Package: SOT23-6; PartNumber: LTC3426
footprint SOT23-6_L2.9-W1.6-P0.95
pins: 1 SW, 2 GND, 3 FB, 4 ~{SHDN}, 5 VOUT, 6 VIN

## LTC4054
designator U?
Battery Charger; Package: SOT23-5; PartNumber: LTC4054
footprint SOT23-5_L2.9-W1.6-P0.95
pins: 1 CHRG, 2 GND, 3 BAT, 4 VCC, 5 PROG

## MAX17048
designator U?, comment MAX17048G+
Gauge; MFR: ADI/MAXIM; Package: TDFN-8-EP; PartNumber: MAX17048G+
pins: 1 CTG, 2 CELL, 3 VDD, 4 GND, 5 ~{ALRT}, 6 QSTRT, 7 SCL, 8 SDA, 9 EPAD

## MP3302
designator U?
WLED Driver; PartNumber: MP3302
footprint SOT23-5_L2.9-W1.6-P0.95
pins: 1 SW, 2 GND, 3 FB, 4 EN, 5 IN

## REF30xx
designator U?
Voltage reference source; MFR: TI; Package: SOT-23; PartNumber: REF30xx
footprint SOT23-3_L2.9-W1.3-P1.9
pins: 1 VIN, 2 VOUT, 3 GND

## RS3236
designator U?, comment RS3236-xx
RUNIC LDO 500mA; MFR: RUNIC; Package: SOT23-5; PartNumber: RS3236-xx
footprint SOT23-5_L2.9-W1.6-P0.95
pins: 1 IN, 2 GND, 3 EN, 4 BP/FB/NC, 5 OUT

## RT9193
designator U?
Power; Package: SOT23-5; PartNumber: RT9193
footprint SOT23-5_L2.9-W1.6-P0.95
pins: 1 VIN, 2 GND, 3 EN (power), 4 BYP, 5 VOUT

## SP6205
designator U?
Power; Package: SOT23-5; PartNumber: SP6205
footprint SOT23-5_L2.9-W1.6-P0.95
pins: 1 VIN, 2 GND, 3 EN (power), 4 BYP, 5 VOUT

## TLV1117
designator U?
Power; Package: *; PartNumber: TLV1117
footprint SOT223-3_L6.5-W3.5-P2.3
pins: 1 GND (power), 2 OUT (power), 3 IN (power)

## TP4056
designator U?
Li Battary Charger; Package: SOT223-3; PartNumber: TP4056
footprint SOP-8_L5.0-W3.8-P1.27-EP
pins: 1 TEMP, 2 PROG, 3 GND (power), 4 VCC (power), 5 BAT, 6 STDBY, 7 CHRG, 8 CE, 9 EPAD (power)

## TPS28225
designator U?
MOSFET Driver; Package: *; PartNumber: TPS28225
footprint SOP-8_L5.0-W3.8-P1.27
pins: 1 UGATE, 2 BOOT, 3 PWM, 4 GND, 5 LGATE, 6 VDD, 7 EN/PG, 8 PHASE

## TPS61322xx
designator U?
Power; Package: SOT23-5; PartNumber: TPS61322xx
footprint SOT23-5_L2.9-W1.6-P0.95
pins: 1 SW, 2 GND, 3 NC, 4 VOUT, 5 NC

## TPS72301DBVR
designator U?, comment TPS72301DBV
LDO NEG; MFR: Texas Instruments; Package: SOT23-5(DBV0005A); PartNumber: TPS72301DBV
footprint SOT23-5_L2.9-W1.6-P0.95
pins: 1 GND (power), 2 IN (power), 3 EN (in), 4 FB (in), 5 OUT (power)

## TXB0108
designator U?
VoltageLevel; Package: *; PartNumber: TXB0108
footprint TSSOP-20_L6.5-W4.4-P0.65
pins: 1 A1, 2 VCCA, 3 A2, 4 A3, 5 A4, 6 A5, 7 A6, 8 A7, 9 A8, 10 OE, 11 GND, 12 B8, 13 B7, 14 B6, 15 B5, 16 B4, 17 B3, 18 B2, 19 VCCB, 20 B1

## URB_LD-20WR3
designator SMPS?
MORNSUN; Package: DIP; PartNumber: URB_LD-20WR3
pins: 1 Ctrl, 2 GND, 3 Vin, 4 +Vo, 5 Trim, 6 0V

## URB_S-10WR3
designator SMPS?, comment URB2405S-10WR3
MORNSUN DCDC; MFR: MORNSUN; Package: SIP8; PartNumber: URB2405S-10WR3
pins: 1 GND, 2 Vin, 3 Ctrl, 5 NC, 6 +Vo, 7 0V, 8 NC

## URB_YMD-6WR3
designator SMPS?
MORNSUN; MFR: MORNSUN; Package: DIP; PartNumber: URB_YMD-6WR3
pins: 1 GND, 2 Vin, 3 +Vo, 4 No Pin, 5 0V

## URB_YMD-10WR3
designator SMPS?
MORNSUN; MFR: MORNSUN; Package: DIP; PartNumber: URB_YMD-10WR3
pins: 1 GND, 2 Vin, 3 +Vo, 4 No Pin, 5 0V, 6 Ctrl

## URB_YMD-20WR3
designator SMPS?
MORNSUN; MFR: MORNSUN; Package: DIP; PartNumber: URB_YMD-20WR3
pins: 1 Ctrl, 2 GND, 3 Vin, 4 +Vo, 5 Trim, 6 0V

## URB_YMD-20WR3(TLPTEC)
designator SMPS?, comment URB_YMD-20WR3
TLPTEC; MFR: YLPTEC; Package: DIP; PartNumber: URB_YMD-20WR3
pins: 1 Vin-, 2 Vin+, 3 +Vo, 4 Trim, 5 GND, 6 Ctrl


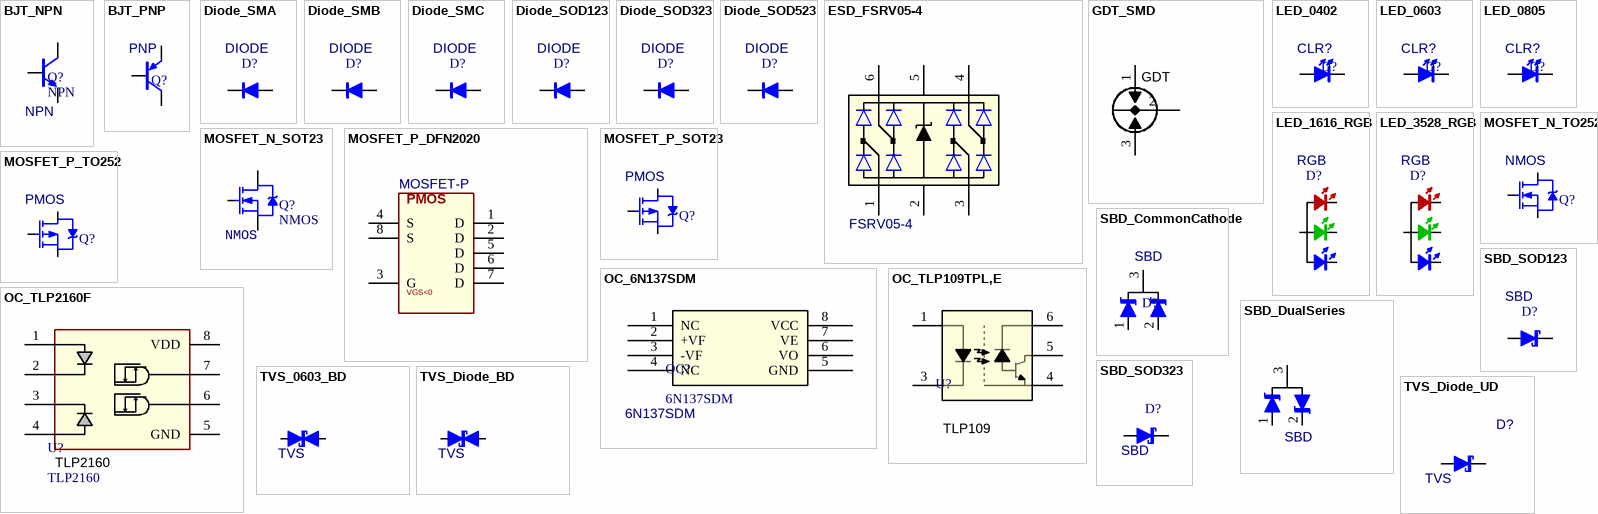
[diagram p5: symbols BJT_NPN to TVS_Diode_UD]

## BJT_NPN
designator Q?, comment NPN
Transistor; Mfr_Name: Mfr?; Package: SOT23-3; PartNumber: NPN
footprint SOT23-3_L2.9-W1.3-P1.9
pins: 1 B, 2 E, 3 C

## BJT_PNP
designator Q?, comment PNP
Transistor; Mfr_Name: Mfr?; Package: SOT23-3; PartNumber: PNP
footprint SOT23-3_L2.9-W1.3-P1.9
pins: 1 B, 2 E, 3 C

## Diode_SMA
designator D?, comment DIODE
Mfr_Name: Mfr?; Package: SMA; PartNumber: DIODE
footprint DO-214AC_L5.4-W2.7-RD (SMA)
pins: 1, 2

## Diode_SMB
designator D?, comment DIODE
Mfr_Name: Mfr?; Package: SMB; PartNumber: DIODE
footprint DO-214AA_L5.3-W3.6-RD (SMB)
pins: 1, 2

## Diode_SMC
designator D?, comment DIODE
Mfr_Name: Mfr?; Package: SMC; PartNumber: DIODE
footprint DO-214AB_L7.9-W6.0-RD (SMC)
pins: 1, 2

## Diode_SOD123
designator D?, comment DIODE
Mfr_Name: Mfr?; Package: SOD123; PartNumber: DIODE
footprint SOD-123_L2.7-W1.6-RD
pins: 1, 2

## Diode_SOD323
designator D?, comment DIODE
Mfr_Name: Mfr?; Package: SOD323; PartNumber: DIODE
footprint SOD-323_L1.7-W1.3-RD
pins: 1, 2

## Diode_SOD523
designator D?, comment DIODE
Mfr_Name: Mfr?; Package: SOD523; PartNumber: DIODE
footprint SOD-523_L1.2-W0.8-RD
pins: 1, 2

## ESD_FSRV05-4
designator U?, comment FSRV05-4
静电和浪涌保护; Mfr_Name: FUXINSEMI; Package: SOT-23-6; PartNumber: FSRV05-4
footprint SOT23-6_L2.9-W1.6-P0.95
pins: 1, 2, 3, 4, 5, 6

## GDT_SMD
designator GDT?, comment GDT
Gas discharge tube; Mfr_Name: Mfr?; Package: PkgRef; PartNumber: GDT
footprint DIO-DT-SMD_L7.2-W5.0
pins: 1, 2, 3

## LED_0402
designator D?, comment CLR?
LED; Mfr_Name: Mfr?; Package: 0402; PartNumber: CLR?
footprint LED0402-RD-YELLOW
footprint LED0402-RD-RED
footprint LED0402-RD-ORANGE
footprint LED0402-RD-GREEN
footprint LED0402-RD-BLUE
pins: 1, 2

## LED_0603
designator D?, comment CLR?
LED; Mfr_Name: Mfr?; Package: 0603; PartNumber: CLR?
footprint LED0603-RD-YELLOW
footprint LED0603-RD-BLUE
footprint LED0603-RD-RED
footprint LED0603-RD-ORANGE
footprint LED0603-RD-GREEN
pins: 1, 2

## LED_0805
designator D?, comment CLR?
LED; Mfr_Name: Mfr?; Package: 0805; PartNumber: CLR?
footprint LED0805-RD-YELLOW
footprint LED0805-RD-RED
footprint LED0805-RD-ORANGE
footprint LED0805-RD-GREEN
footprint LED0805-RD-BLUE
pins: 1, 2

## LED_1616_RGB
designator D?, comment RGB
LED; Mfr_Name: Mfr?; Package: 1616; PartNumber: RGB
pins: 1 R, 2 G, 3 B, 4 A

## LED_3528_RGB
designator D?, comment RGB
LED; Mfr_Name: Mfr?; Package: 3528; PartNumber: RGB
pins: 1 R, 2 G, 3 B, 4 A

## MOSFET_N_SOT23
designator Q?, comment NMOS
MOSFET; Mfr_Name: Mfr?; Package: SOT23-3; PartNumber: NMOS
footprint SOT23-3_L2.9-W1.3-P1.9
pins: 1 G, 2 S, 3 D

## MOSFET_N_TO252
designator Q?, comment NMOS
MOSFET; Mfr_Name: Mfr?; Package: TO252; PartNumber: NMOS
footprint TO-252-2_L6.1-W6.5-P4.57 (TO252AA,DPAK,SC-63)
pins: 1 G, 3 S, 4 D

## MOSFET_P_DFN2020
designator Q?, comment MOSFET-P
MOSFET; MFR: *; Package: UDFN2020-6; PartNumber: MOSFET-P
footprint U-DFN2020-6(TYPE-F)
pins: 1 D, 2 D, 3 G, 4 S, 5 D, 6 D, 7 D, 8 S
text: PMOS; VGS<0

## MOSFET_P_SOT23
designator Q?, comment PMOS
MOSFET; Mfr_Name: Mfr?; Package: SOT23; PartNumber: PMOS
footprint SOT23-3_L2.9-W1.3-P1.9
pins: 1 G, 2 S, 3 D

## MOSFET_P_TO252
designator Q?, comment PMOS
MOSFET; Mfr_Name: Mfr?; Package: TO252; PartNumber: PMOS
footprint TO-252-2_L6.1-W6.5-P4.57 (TO252AA,DPAK,SC-63)
pins: 1 G, 3 S, 4 D

## OC_6N137SDM
designator OC?, comment 6N137SDM
Logic OC; Mfr_Name: onsemi; Package: SOP-8-2.54mm; PartNumber: 6N137SDM
footprint SOP-8_L9.7-W6.5-P2.54 (6.5*9.66*3.5mm（长宽高）)
pins: 1 NC, 2 +VF (power), 3 -VF (power), 4 NC, 5 GND (power), 6 VO (power), 7 VE (power), 8 VCC (power)

## OC_TLP109TPL,E
designator U?, comment TLP109
Logic OC; Mfr_Name: Toshiba Electronic Devices & Storage Corp.; Package: SO-5-4.6mm; PartNumber: TLP109
footprint SOP-5_L4.6-W3.7-P1.27-OPTO
pins: 1, 3, 4, 5, 6

## OC_TLP2160F
designator U?, comment TLP2160
Logic OC; Mfr_Name: Toshiba Electronic Devices & Storage Corp.; Package: SOP-8; PartNumber: TLP2160
footprint SOP-8_L5.0-W3.8-P1.27-OPTO
pins: 1, 2, 3, 4, 5 GND, 6, 7, 8 VDD

## SBD_CommonCathode
designator D?, comment SBD
Schottky Diode; Mfr_Name: Mfr?; Package: SOT23-3; PartNumber: SBD
footprint SOT23-3_L2.9-W1.3-P1.9
pins: 1 A, 2 A, 3 K

## SBD_DualSeries
designator D?, comment SBD
SBD_DualSeries; Mfr_Name: Mfr?; Package: Pkg?; PartNumber: SBD
footprint SOT23-3_L2.9-W1.3-P1.9
pins: 1 A, 2 K, 3 K

## SBD_SOD123
designator D?, comment SBD
Schottky Diode; Mfr_Name: Mfr?; Package: SOD123; PartNumber: SBD
footprint SOD-123_L2.7-W1.6-RD
pins: 1, 2
